# Altium footprint library PVV.PcbLib: 88 footprints (part 1 of 6)
Each footprint in its own frame and in the unit in brackets; x right, y up, seen from the top. Pads: shape width x height; smd on the part's side, far side on the other; paste and mask are expansions set on the pad; w line width, h text height; cw(c..) or ccw(c..) is an arc to the next point about the centre after c.
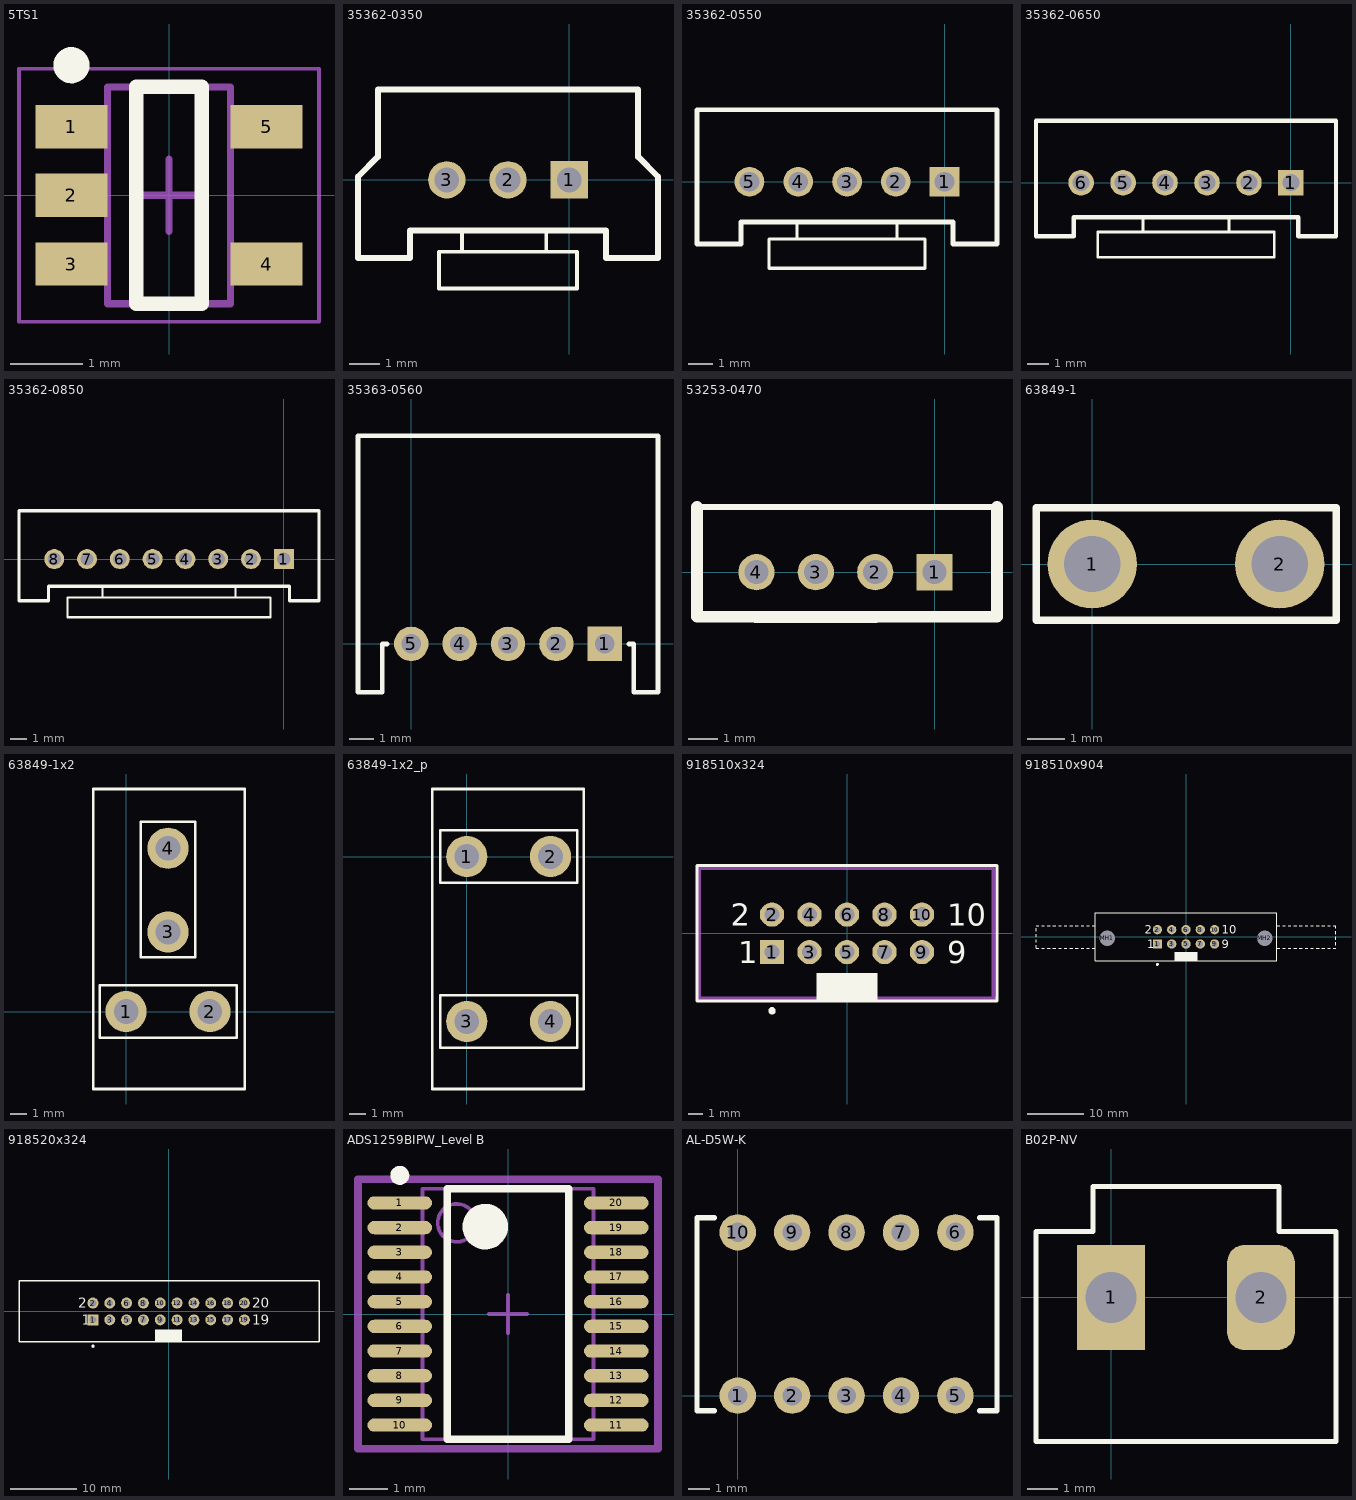
[diagram p0: the footprints below, top view; thin cyan lines are the x and y axes]

## 5TS1 [mm] "SOT23, 5-Leads, Body 2,90x2,80mm, Pitch 0,95mm, IPC Medium Density"
height 1
pads (5):
  rect 1x0.6 smd: 1(-1.35,0.95) 2(-1.35,0) 3(-1.35,-0.95) 4(1.35,-0.95) 5(1.35,0.95)
Top Overlay:
  circle w0.25: c-1.35,1.8 r0.125
  lines w0.2: -0.45,-1.5 0.45,-1.5 0.45,1.5 -0.45,1.5 -0.45,-1.5
Mechanical 13:
  lines w0.1: -0.85,-1.5 -0.85,1.5 0.85,1.5 0.85,-1.5 -0.85,-1.5
Mechanical 15:
  lines w0.05: -2.075,-1.75 -2.075,1.75 2.075,1.75 2.075,-1.75 -2.075,-1.75
  lines w0.1: -0.5,0 0.5,0 ; 0,-0.5 0,0.5
3D body: height 1, standoff 0.05, extent -0.85,-1.5 0.85,1.5

## 35362-0350 [mil] "Sherlock 3"
pads (3):
  rect 48x48 / inner round 0 / far side rect 48x48 hole 32 mask+4.97: 1(0,0)
  round 48 / inner round 0 / far side round 48 hole 32 mask+4.97: 2(-78.73,0) 3(-157.47,0)
Top Overlay:
  lines w5: -167.32,-139.75 9.84,-139.75 9.84,-92.52 -167.32,-92.52 -167.32,-139.75 ; -137.8,-92.52 -137.8,-64.95 -29.53,-64.95 -29.53,-92.52 -137.8,-92.52
  lines w7.87: -271.65,-100.38 -271.65,3.94 -246.06,29.53 -246.06,116.13 88.58,116.13 88.58,29.53 114.17,3.94 114.17,-100.38 84.63,-100.38 47.24,-100.38 47.24,-64.95 -204.72,-64.95 -204.72,-100.38 -246.06,-100.38 -271.65,-100.38
3D body "353620350.stp": height 335.43, standoff -129.13, extent -269.67,-102.36 112.21,116.15

## 35362-0550 [mil]
pads (5):
  rect 48x48 / inner round 0 / far side rect 48x48 hole 32 mask+4.97: 1(0,0)
  round 48 / inner round 0 / far side round 48 hole 32 mask+4.97: 2(-78.73,0) 3(-157.47,0) 4(-236.22,0) 5(-314.95,0)
Top Overlay:
  lines w5: -283.45,-139.75 -31.48,-139.75 -31.48,-92.52 -283.45,-92.52 -283.45,-139.75 ; -238.18,-92.52 -238.18,-64.95 -76.77,-64.95 -76.77,-92.52 -238.18,-92.52
  lines w7.87: -399.6,-100.38 -328.73,-100.38 -328.73,-64.95 13.77,-64.95 13.77,-100.38 84.63,-100.38 84.63,116.13 -399.6,116.13 -399.6,-100.38
3D body "353620550.stp": height 335.32, standoff -129.24, extent -399.12,-102.23 85.13,116.28

## 35362-0650 [mil] "Sherlock 6 конт LS=2 2A 125V PCB"
pads (6):
  rect 48x48 / inner round 0 / far side rect 48x48 hole 32 mask+4.97: 1(0,0)
  round 48 / inner round 0 / far side round 48 hole 32 mask+4.97: 2(-78.73,0) 3(-157.47,0) 4(-236.22,0) 5(-314.95,0) 6(-393.7,0)
Top Overlay:
  lines w5: -277.55,-92.52 -277.55,-64.95 ; -238.18,-92.52 -76.77,-92.52 ; -238.18,-64.95 -76.77,-64.95 ; -116.14,-92.52 -116.14,-64.95 ; -362.19,-139.75 -362.19,-92.52 -31.48,-92.52 -31.48,-139.75 -362.2,-139.75
  lines w7.87: -407.48,-64.95 -243.11,-64.95 -71.86,-64.95 13.77,-64.95 13.77,-100.38 84.63,-100.38 84.63,116.13 -478.35,116.13 -478.34,-100.38 -407.47,-100.38 -407.47,-64.95
3D body "353620650.stp": height 335.16, standoff -129.41, extent -478.34,-102.35 84.66,116.15

## 35362-0850 [mil] "Sherlock 8 конт LS=2 2A 125V PCB"
pads (8):
  rect 48x48 / inner round 0 / far side rect 48x48 hole 32 mask+4.97: 1(0,0)
  round 48 / inner round 0 / far side round 48 hole 32 mask+4.97: 2(-78.73,0) 3(-157.47,0) 4(-236.22,0) 5(-314.95,0) 6(-393.7,0) 7(-472.44,0) 8(-551.18,0)
Top Overlay:
  lines w5: -519.68,-139.75 -31.48,-139.75 -31.48,-92.52 -519.68,-92.52 ; -519.67,-139.75 -519.67,-92.52 ; -435.03,-92.52 -435.03,-64.95 ; -238.18,-92.52 -76.77,-92.52 ; -238.18,-64.95 -76.77,-64.95 ; -116.14,-92.52 -116.14,-64.95
  lines w7.87: -635.83,116.13 84.63,116.13 84.63,-100.38 13.77,-100.38 13.77,-64.95 -71.86,-64.95 -243.11,-64.95 -564.96,-64.95 -564.95,-100.38 -635.82,-100.38 -635.82,116.13
3D body "353620850.stp": height 335.16, standoff -129.41, extent -635.82,-102.36 84.66,116.15

## 35363-0560 [mil]
pads (5):
  rect 56x56 / inner round 0 / far side rect 56x56 hole 32 mask+4.97: 1(314.95,0)
  round 56 / inner round 0 / far side round 56 hole 32 mask+4.97: 2(236.22,0) 3(157.47,0) 4(78.73,0) 5(0,0)
Top Overlay:
  lines w7.87: -39.37,0 -47.23,0 -47.23,-78.73 -86.6,-78.73 -86.6,338.57 0,338.57 314.93,338.57 401.58,338.57 401.58,-78.73 362.22,-78.73 362.22,0 354.35,0
3D body "353630560.stp": height 217.27, standoff -125.25, extent -84.12,-77.06 400.13,336.33

## 53253-0470 [mil]
pads (4):
  rect 48x48 / inner round 0 / far side rect 48x48 hole 32 mask+4.97: 1(0,0)
  round 48 / inner round 0 / far side round 48 hole 32 mask+4.97: 2(-78.73,0) 3(-157.47,0) 4(-236.22,0)
Top Overlay:
  lines w5: -238.18,-64.95 -76.77,-64.95
  lines w7.87: -314.96,86.61 82.68,86.61
  lines w15.75: -314.96,86.61 -314.96,-59.06 82.68,-59.06 82.68,86.61
3D body "532530470.stp": height 217.04, standoff -97.93, extent -314.95,-59.05 78.75,84.65

## 63849-1 [mil]
height 400
pads (2):
  round 95 hole 60: 1(0,0) 2(200,0)
Top Overlay:
  lines w8: -60,-60 -60,60 260,60 260,-60 -60,-60
3D body "c-63849-1-k-3d.stp": height 409, standoff -143, extent -56,-60 256,61.5
3D body "c-154719-1-av-3d.stp": height 955.12, standoff 0, extent -106.1,-140.79 278.54,142.28
3D body "c-154718-3-as-3d.stp": height 913.98, standoff 38.06, extent -46.55,-98.43 243.4,113.8

## 63849-1x2 [mm]
pads (4):
  round 2.5 hole 1.5: 1(0,0) 2(5.08,0) 3(2.54,4.826) 4(2.54,9.906)
Top Overlay:
  lines w0.152: -2,-4.7 7.2,-4.7 7.2,13.5 -2,13.5 -2,-4.7 ; -1.6,-1.6 -1.6,1.6 6.7,1.6 6.7,-1.6 -1.6,-1.6 ; 0.9,3.3 0.9,11.5 4.2,11.5 4.2,3.3 0.9,3.3
3D body "c-154717-3-at-3d.stp": height 23.31, standoff 1.07, extent -1.143,-2.555 6.222,3.195
3D body "c-154717-3-at-3d.stp": height 23.31, standoff 1.07, extent -0.655,3.654 5.095,11.019
3D body "c-63849-1-k-3d.stp": height 10.22, standoff -3.8, extent -1.422,-1.543 6.503,1.543
3D body "c-63849-1-k-3d.stp": height 10.21, standoff -3.81, extent 0.997,3.404 4.083,11.328
3D body "c-0926522-02-r-3d.stp": height 25.03, standoff 0.9, extent -1.96,-4.705 7.19,13.445

## 63849-1x2_p [mm] "DUAL TAB FASTON PCB (926521-2)"
pads (4):
  round 2.5 hole 1.5: 1(0,0) 2(5.08,0) 3(0,-10) 4(5.08,-10)
Top Overlay:
  lines w0.152: -2.1,-14.1 7.1,-14.1 7.1,4.1 -2.1,4.1 -2.1,-14.1 ; -1.6,-11.6 6.7,-11.6 6.7,-8.4 -1.6,-8.4 -1.6,-11.6 ; -1.6,-1.6 -1.6,1.6 6.7,1.6 6.7,-1.6 -1.6,-1.6
3D body "c-0926521-01-h-3d.stp": height 25.3, standoff 1, extent -2.06,-13.95 7.14,3.95
3D body "c-154717-3-at-3d.stp": height 23.31, standoff 1.07, extent -1.143,-2.555 6.222,3.195
3D body "c-154717-3-at-3d.stp": height 23.31, standoff 1.07, extent -1.142,-13.195 6.223,-7.445
3D body "c-63849-1-k-3d.stp": height 10.22, standoff -3.8, extent -1.422,-1.543 6.503,1.543
3D body "c-63849-1-k-3d.stp": height 10.21, standoff -3.81, extent -1.422,-11.543 6.503,-8.457

## 918510x324 [mm] "Connector; IDC, Low Profile Male Header, Thru-Hole; 10 Position; Vertical; Pitch 2.54 mm; Body 20.32 x 9.2 x 9.45 mm (LxWxH)"
height 9.45
pads (10):
  rect 1.65x1.65 hole 1: 1(-5.08,-1.27)
  round 1.65 hole 1: 2(-5.08,1.27) 3(-2.54,-1.27) 4(-2.54,1.27) 5(0,-1.27) 6(0,1.27) 7(2.54,-1.27) 8(2.54,1.27) 9(5.08,-1.27) 10(5.08,1.27)
Top Overlay:
  circle w0.25: c-5.08,-5.25 r0.125
  rectangle: -2.05,-4.6 2.05,-2.7
  lines w0.2: -10.16,-4.6 10.16,-4.6 10.16,4.6 -10.16,4.6 -10.16,-4.6
  text "9" at 6.78,-2.02 h1.5
  text "10" at 6.78,0.52 h1.5
  text "1" at -7.38,-2.02 h1.5
  text "2" at -7.88,0.52 h1.5
Mechanical 13:
  lines w0.254: -10,-4.4 10,-4.4 9.9,-4.3 9.9,4.4 -10,4.4 -10,-4.4 ; -10,-4.4 -10,-4.4
3D body "User Library-BH-10___64.step": height 9.16, standoff -2.99, extent -10.18,-4.5 10.18,4.7

## 918510x904 [mm] "Connector; IDC, Thru-Hole; 10 Position; Vertical; Pitch 2.54 mm; Body 32.30 x 8.5 x 25.75 mm (LxWxH), Locking levers"
height 25.75
pads (12):
  rect 1.65x1.65 hole 1: 1(-5.08,-1.27)
  round 1.65 hole 1: 2(-5.08,1.27) 3(-2.54,-1.27) 4(-2.54,1.27) 5(0,-1.27) 6(0,1.27) 7(2.54,-1.27) 8(2.54,1.27) 9(5.08,-1.27) 10(5.08,1.27)
  round 2.5 hole 2.8 unplated: MH1(-13.97,-0.25) MH2(13.97,-0.25)
Top Overlay:
  circle w0.25: c-5.08,-4.9 r0.125
  rectangle: -2.05,-4.25 2.05,-2.7
  lines w0.2: -26.65,-1.5 -26.65,-2 -26.15,-2 ; -26.65,-1 -26.65,-0.5 ; -26.65,0 -26.65,0.5 ; -26.65,1 -26.65,1.5 ; -26.65,2 -26.15,2 ; -25.65,-2 -25.15,-2 ; -25.65,2 -25.15,2 ; -24.65,-2 -24.15,-2 ; -24.65,2 -24.15,2 ; -23.65,-2 -23.15,-2 ; -23.65,2 -23.15,2 ; -22.65,-2 -22.15,-2 ; -22.65,2 -22.15,2 ; -21.65,-2 -21.15,-2 ; -21.65,2 -21.15,2 ; -20.65,-2 -20.15,-2 ; -20.65,2 -20.15,2 ; -19.65,-2 -19.15,-2 ; -19.65,2 -19.15,2 ; -18.65,-2 -18.15,-2 ; -18.65,2 -18.15,2 ; -17.65,-2 -17.15,-2 ; -17.65,2 -17.15,2 ; -16.65,-2 -16.15,-2 ; -16.65,2 -16.15,2 ; 16.15,-2 16.65,-2 ; 16.15,2 16.65,2 ; 17.15,-2 17.65,-2 ; 17.15,2 17.65,2 ; 18.15,-2 18.65,-2 ; 18.15,2 18.65,2 ; 19.15,-2 19.65,-2 ; 19.15,2 19.65,2 ; 20.15,-2 20.65,-2 ; 20.15,2 20.65,2 ; 21.15,-2 21.65,-2 ; 21.15,2 21.65,2 ; 22.15,-2 22.65,-2 ; 22.15,2 22.65,2 ; 23.15,-2 23.65,-2 ; 23.15,2 23.65,2 ; 24.15,-2 24.65,-2 ; 24.15,2 24.65,2 ; 25.15,-2 25.65,-2 ; 25.15,2 25.65,2 ; 26.15,-2 26.65,-2 ; 26.15,2 26.65,2 26.65,1.5 ; 26.65,-1.5 26.65,-1 ; 26.65,-0.5 26.65,0 ; 26.65,0.5 26.65,1 ; -16.15,-4.25 16.15,-4.25 16.15,4.25 -16.15,4.25 -16.15,-4.25
  text "9" at 6.36,-2.02 h1.5
  text "10" at 6.36,0.52 h1.5
  text "1" at -6.86,-2.02 h1.5
  text "2" at -7.36,0.52 h1.5
3D body "09185105909.stp": height 25.84, standoff -3.11, extent -16.15,-4.25 16.15,4.25

## 918520x324 [mm] "Connector; IDC, Low Profile Male Header, Thru-Hole; 20 Position; Vertical; Pitch 2.54 mm; Body 33.02 x 9.2 x 9.45 mm (LxWxH)"
height 9.45
pads (20):
  rect 1.65x1.65 hole 1: 1(-11.43,-1.27)
  round 1.65 hole 1: 2(-11.43,1.27) 3(-8.89,-1.27) 4(-8.89,1.27) 5(-6.35,-1.27) 6(-6.35,1.27) 7(-3.81,-1.27) 8(-3.81,1.27) 9(-1.27,-1.27) 10(-1.27,1.27) 11(1.27,-1.27) 12(1.27,1.27) 13(3.81,-1.27) 14(3.81,1.27) 15(6.35,-1.27) 16(6.35,1.27) 17(8.89,-1.27) 18(8.89,1.27) 19(11.43,-1.27) 20(11.43,1.27)
Top Overlay:
  circle w0.25: c-11.43,-5.25 r0.125
  rectangle: -2.05,-4.6 2.05,-2.7
  lines w0.2: -22.6,-4.6 -22.6,-1.99 -22.6,3.81 -22.6,4.6 22.7,4.6 22.7,-4.6 -22.6,-4.6
  text "19" at 12.63,-2.02 h1.5
  text "20" at 12.63,0.52 h1.5
  text "1" at -13.13,-2.02 h1.5
  text "2" at -13.63,0.52 h1.5
3D body "091X520X904_100081363MOD000B.STP": height 25.77, standoff -2.88, extent -22.5,-4.145 22.5,4.355

## ADS1259BIPW_Level B [mm] "TSSOP-20"
pads (20):
  oval 1.7x0.35 smd paste+0 mask+0: 1(-2.85,2.925) 2(-2.85,2.275) 3(-2.85,1.625) 4(-2.85,0.975) 5(-2.85,0.325) 6(-2.85,-0.325) 7(-2.85,-0.975) 8(-2.85,-1.625) 9(-2.85,-2.275) 10(-2.85,-2.925) 11(2.85,-2.925) 12(2.85,-2.275) 13(2.85,-1.625) 14(2.85,-0.975) 15(2.85,-0.325) 16(2.85,0.325) 17(2.85,0.975) 18(2.85,1.625) 19(2.85,2.275) 20(2.85,2.925)
Top Overlay:
  circle w0.6: c-0.6,2.3 r0.3
  circle w0.25: c-2.85,3.65 r0.125
  lines w0.2: -1.6,-3.3 1.6,-3.3 1.6,3.3 -1.6,3.3 -1.6,-3.3
Mechanical 10:
  lines w0.2: -3.95,-3.55 -3.95,3.55 3.95,3.55 3.95,-3.55 -3.95,-3.55
  text ".Designator" at 0,0 h1
Mechanical 12:
  circle w0.1: c-1.35,2.4 r0.5
  lines w0.1: -2.25,-3.3 2.25,-3.3 2.25,3.3 -2.25,3.3 -2.25,-3.3
Mechanical 15:
  lines w0.1: -0.5,0 0.5,0 ; 0,-0.5 0,0.5
  lines w0.2: -3.95,-3.55 -3.95,3.55 3.95,3.55 3.95,-3.55 -3.95,-3.55
3D body "IC_Texas_Instruments_ADS1259BIPW_eec.STEP": height 0.25, standoff 0, extent -3.95,-3.55 3.95,3.55

## AL-D5W-K [mm]
pads (10):
  round 1.7 hole 0.9: 1(0,0) 2(2.54,0) 3(5.08,0) 4(7.62,0) 5(10.16,0) 6(10.16,7.62) 7(7.62,7.62) 8(5.08,7.62) 9(2.54,7.62) 10(0,7.62)
Top Overlay:
  lines w0.254: -1.1,-0.7 -1.9,-0.7 -1.9,8.3 -1.1,8.3 ; 11.3,-0.7 12.1,-0.7 12.1,8.3 11.3,8.3
3D body "User Library-a-24w-k-1.step": height 5.11, standoff -3.26, extent -1.92,-0.69 12.08,8.31

## B02P-NV [mm]
pads (2):
  rect 2.25x3.5 hole 1.7: 1(0,0)
  rrect50% 2.25x3.5 hole 1.7: 2(5,0)
Top Overlay:
  lines w0.152: -2.5,-4.8 -2.5,2.2 -0.6,2.2 -0.6,3.7 5.6,3.7 5.6,2.2 7.5,2.2 7.5,-4.8 -2.5,-4.8
3D body "B02P-NV.STEP": height 10.92, standoff -3.68, extent -2.5,-4.8 7.5,3.7